# Altium footprint library All_Components.PcbLib: 55 footprints (part 3 of 4)
Each footprint in its own frame and in the unit in brackets; x right, y up, seen from the top. Pads: shape width x height; smd on the part's side, far side on the other; paste and mask are expansions set on the pad; w line width, h text height; cw(c..) or ccw(c..) is an arc to the next point about the centre after c.
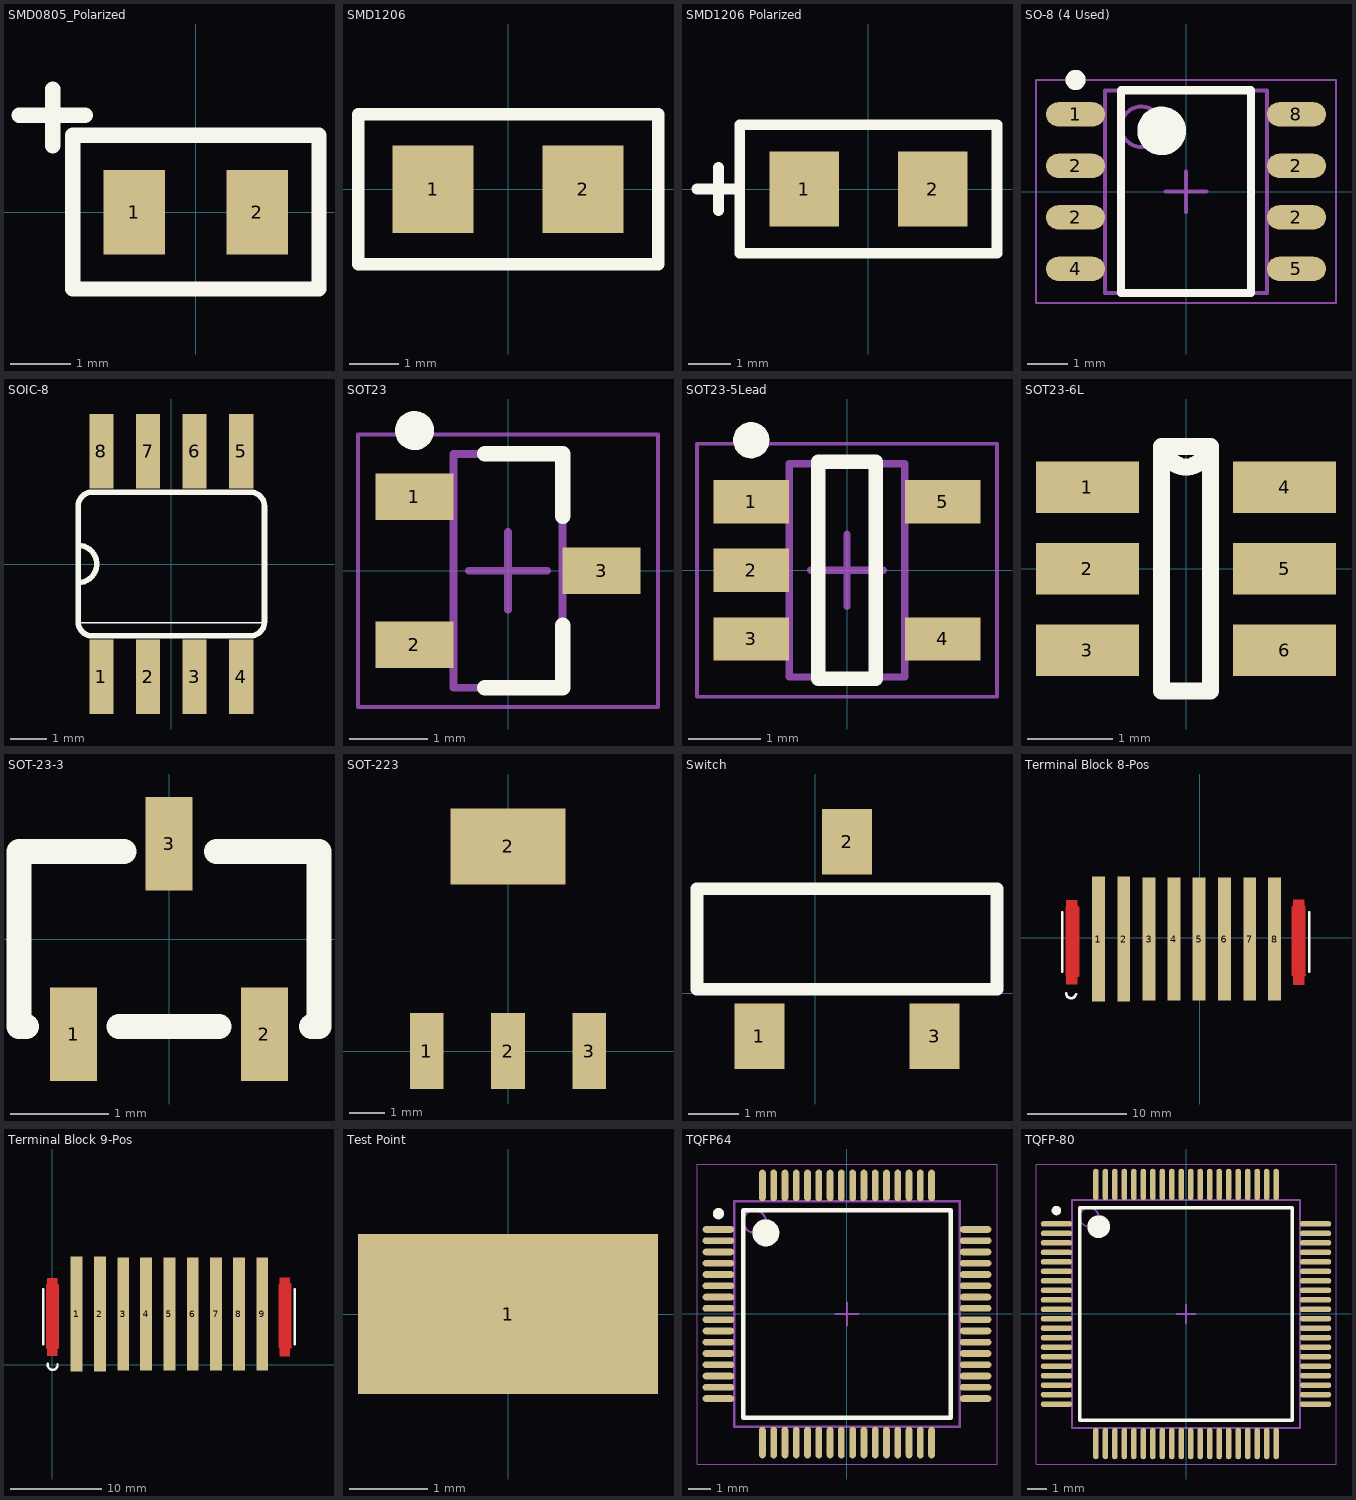
[diagram p2: the footprints below, top view; thin cyan lines are the x and y axes]

## SMD0805_Polarized [mil]
height 35.43
pads (2):
  rect 40x55 smd: 1(-40,0) 2(40,0)
Top Overlay:
  lines w10: -115,63 -72,63 ; -93,43 -93,80 ; -80,-50 80,-50 80,50 -80,50 -80,-7.5 -80,-50
3D body: height 19.68, standoff 0, extent -39.36,-24.8 39.38,24.42

## SMD1206 [mil]
pads (2):
  rect 65x70 smd: 1(-60,0) 2(60,0)
Top Overlay:
  lines w10: -120,-60 120,-60 120,60 -120,60 -120,-60
3D body: height 21.65, standoff 0, extent -61.02,-30.39 61.03,30.71

## SMD1206 Polarized [mil]
pads (2):
  rect 65x70 smd: 1(-60,0) 2(60,0)
Top Overlay:
  lines w10: -160,0 -120,0 ; -140,-20 -140,20 ; -120,-60 120,-60 120,60 -120,60 -120,-60
3D body: height 39.37, standoff 0, extent -65.49,-32.01 60.49,30.99

## SO-8 (4 Used) [mm] "SOIC, 8-Leads, Body 4.90x3.90mm, Pitch 1.27mm, IPC Medium Density"
height 1.75
pads (8):
  oval 1.45x0.6 smd: 1(-2.725,1.905) 2(-2.725,-0.635) 2(-2.725,0.635) 2(2.725,-0.635) 2(2.725,0.635) 4(-2.725,-1.905) 5(2.725,-1.905) 8(2.725,1.905)
Top Overlay:
  circle w0.6: c-0.6,1.5 r0.3
  circle w0.25: c-2.725,2.755 r0.125
  lines w0.2: -1.6,-2.5 1.6,-2.5 1.6,2.5 -1.6,2.5 -1.6,-2.5
Mechanical 13:
  circle w0.1: c-1.1,1.6 r0.5
  lines w0.1: -2,-2.5 2,-2.5 2,2.5 -2,2.5 -2,-2.5
Mechanical 15:
  lines w0.05: -3.7,-2.75 3.7,-2.75 3.7,2.75 -3.7,2.75 -3.7,-2.75
  lines w0.1: -0.5,0 0.5,0 ; 0,-0.5 0,0.5
3D body: height 1.75, standoff 0.1, extent -2,-2.5 2,2.5

## SOIC-8 [mil]
pads (8):
  rect 26x80 smd mask+3: 1(-75,-121) 2(-25,-121) 3(25,-121) 4(75,-121) 5(75,121) 6(25,121) 7(-25,121) 8(-75,121)
Top Overlay:
  lines w2: -100,-63 100,-63
  lines w6: -100,-20 ccw(c-100,0) -100,20 ; -100,-20 -100,20 ; -100,-20 -100,-62 ccw(c-85,-62) -85,-77 85,-77 ccw(c85,-62) 100,-62 100,62 ccw(c85,62) 85,77 -85,77 ccw(c-85,62) -100,62 -100,20
3D body: height 68, standoff 0, extent -103,-76 103,76

## SOT23 [mm] "SOT23, 3-Leads, Body 2.90x2.45mm, Pitch 0.95mm, IPC Medium Density"
height 1.1
pads (3):
  rect 1x0.6 smd: 1(-1.2,0.95) 2(-1.2,-0.95) 3(1.2,0)
Top Overlay:
  circle w0.25: c-1.2,1.8 r0.125
  lines w0.2: -0.3,-1.5 0.7,-1.5 0.7,-0.7 ; -0.3,1.5 0.7,1.5 0.7,0.7
Mechanical 13:
  lines w0.1: -0.7,-1.5 -0.7,1.5 0.7,1.5 0.7,-1.5 -0.7,-1.5
Mechanical 15:
  lines w0.05: -1.925,-1.75 -1.925,1.75 1.925,1.75 1.925,-1.75 -1.925,-1.75
  lines w0.1: -0.5,0 0.5,0 ; 0,-0.5 0,0.5
3D body: height 1, standoff 0, extent -1.257,-1.492 1.293,1.508

## SOT23-5Lead [mm] "SOT23, 5-Leads, Body 2.95x2.80mm, Pitch 0.95mm, IPC Medium Density"
height 1.45
pads (5):
  rect 1.05x0.6 smd: 1(-1.325,0.95) 2(-1.325,0) 3(-1.325,-0.95) 4(1.325,-0.95) 5(1.325,0.95)
Top Overlay:
  circle w0.25: c-1.325,1.8 r0.125
  lines w0.2: -0.4,-1.5 0.4,-1.5 0.4,1.5 -0.4,1.5 -0.4,-1.5
Mechanical 13:
  lines w0.1: -0.8,-1.475 -0.8,1.475 0.8,1.475 0.8,-1.475 -0.8,-1.475
Mechanical 15:
  lines w0.05: -2.075,-1.75 -2.075,1.75 2.075,1.75 2.075,-1.75 -2.075,-1.75
  lines w0.1: -0.5,0 0.5,0 ; 0,-0.5 0,0.5
3D body: height 0.92, standoff 0.01, extent -1.655,-1.501 1.549,1.499

## SOT23-6L [mm] "ESDA6V1BC6"
pads (6):
  rect 1.2x0.6 smd: 1(-1.15,0.95) 2(-1.15,0) 3(-1.15,-0.95) 4(1.15,0.95) 5(1.15,0) 6(1.15,-0.95)
Top Overlay:
  lines w0.2: -0.285,-1.425 0.285,-1.425 0.285,1.425 -0.238,1.425 ccw(c0,1.425) 0.238,1.425 -0.285,1.425 -0.285,-1.425
3D body: height 1.45, standoff 0.1, extent -0.875,-1.525 0.875,1.525

## SOT-23-3 [mm] "ESDCAN24-2BLY"
height 1.499
pads (3):
  rect 0.48x0.95 smd mask+0.076: 1(-0.97,-0.97) 2(0.97,-0.97) 3(0,0.97)
Top Overlay:
  lines w0.254: -1.448,-0.889 -1.524,-0.889 -1.524,0.889 -0.457,0.889 ; -0.508,-0.889 0.508,-0.889 ; 0.483,0.889 1.524,0.889 1.524,-0.889 1.448,-0.889
3D body: height 1.5, standoff 0.1, extent -1.52,-0.875 1.52,0.875

## SOT-223 [mm]
pads (4):
  rect 0.95x2.15 smd mask+0.076: 1(-2.3,0) 2(0,0) 3(2.3,0)
  rect 3.25x2.15 smd mask+0.076: 2(0,5.8)

## Switch [mm]
height 2.5
pads (3):
  rect 1x1.3 smd: 1(-1.118,-0.864) 2(0.635,3.023) 3(2.388,-0.864)
Top Overlay:
  lines w0.254: -2.362,0.076 -2.362,2.083 3.632,2.083 3.632,0.076 -2.362,0.076
3D body: height 2.48, standoff -0.04, extent -2.348,-1.089 3.652,3.111

## Terminal Block 8-Pos [mm]
height 11
pads (8):
  rect 1.3x12.6 smd: 1(-10.2,-0.122) 2(-7.65,-0.122)
  rect 1.3x12.4 smd: 3(-5.1,-0.122) 4(-2.6,-0.122) 5(-0.05,-0.122) 6(2.5,-0.122) 7(5.05,-0.122) 8(7.55,-0.122)
Top Layer:
  rectangle: 9.409,-4.772 10.559,3.878
  rectangle: -13.45,-4.722 -12.3,3.828
  lines w0.254: -13.4,-3.822 -13.4,3.078 -12.3,3.078 -12.25,3.028 -12.25,-3.822 -13.4,-3.822 ; 9.409,-3.722 9.459,-3.772 10.609,-3.772 10.559,-3.722 10.559,3.128 10.509,3.078 9.409,3.078 9.409,-3.722
Top Overlay:
  lines w0.254: -13.85,-3.422 -13.85,2.578 ; -13.454,-5.612 ccw(c-12.954,-5.588) -12.462,-5.683 ; 11.059,-3.422 11.059,2.578

## Terminal Block 9-Pos [mm]
height 11
pads (9):
  rect 1.3x12.6 smd: 1(2.652,5.568) 2(5.202,5.568)
  rect 1.3x12.4 smd: 3(7.752,5.568) 4(10.252,5.568) 5(12.802,5.568) 6(15.352,5.568) 7(17.902,5.568) 8(20.402,5.568) 9(22.952,5.568)
Top Layer:
  rectangle: -0.598,0.968 0.552,9.518
  rectangle: 24.852,0.918 26.002,9.568
  lines w0.254: -0.548,1.868 0.602,1.868 0.602,8.718 0.552,8.768 -0.548,8.768 -0.548,1.868 ; 24.852,1.968 24.852,8.768 25.952,8.768 26.002,8.818 26.002,1.968 26.052,1.918 24.902,1.918 24.852,1.968
Top Overlay:
  lines w0.254: -0.998,2.268 -0.998,8.268 ; -0.494,0.133 ccw(c0.025,0) 0.554,0.085 ; 26.502,2.268 26.502,8.268

## Test Point [mil]
pads (1):
  rect 150x80 smd: 1(0,0)
3D body: height 90, standoff 1, extent -75,-30 75,30

## TQFP64 [mm] "TSQFP, 64-Leads, Body 10.00x10.00mm, Pitch 0.50mm, IPC Medium Density"
height 1.6
pads (64):
  oval 1.4x0.3 smd: 1(-5.7,3.75) 2(-5.7,3.25) 3(-5.7,2.75) 4(-5.7,2.25) 5(-5.7,1.75) 6(-5.7,1.25) 7(-5.7,0.75) 8(-5.7,0.25) 9(-5.7,-0.25) 10(-5.7,-0.75) 11(-5.7,-1.25) 12(-5.7,-1.75) 13(-5.7,-2.25) 14(-5.7,-2.75) 15(-5.7,-3.25) 16(-5.7,-3.75) 33(5.7,-3.75) 34(5.7,-3.25) 35(5.7,-2.75) 36(5.7,-2.25) 37(5.7,-1.75) 38(5.7,-1.25) 39(5.7,-0.75) 40(5.7,-0.25) 41(5.7,0.25) 42(5.7,0.75) 43(5.7,1.25) 44(5.7,1.75) 45(5.7,2.25) 46(5.7,2.75) 47(5.7,3.25) 48(5.7,3.75)
  oval 0.3x1.4 smd: 17(-3.75,-5.7) 18(-3.25,-5.7) 19(-2.75,-5.7) 20(-2.25,-5.7) 21(-1.75,-5.7) 22(-1.25,-5.7) 23(-0.75,-5.7) 24(-0.25,-5.7) 25(0.25,-5.7) 26(0.75,-5.7) 27(1.25,-5.7) 28(1.75,-5.7) 29(2.25,-5.7) 30(2.75,-5.7) 31(3.25,-5.7) 32(3.75,-5.7) 49(3.75,5.7) 50(3.25,5.7) 51(2.75,5.7) 52(2.25,5.7) 53(1.75,5.7) 54(1.25,5.7) 55(0.75,5.7) 56(0.25,5.7) 57(-0.25,5.7) 58(-0.75,5.7) 59(-1.25,5.7) 60(-1.75,5.7) 61(-2.25,5.7) 62(-2.75,5.7) 63(-3.25,5.7) 64(-3.75,5.7)
Top Overlay:
  circle w0.25: c-5.7,4.45 r0.125
  circle w0.6: c-3.6,3.6 r0.3
  lines w0.2: -4.6,-4.6 -4.6,4.6 4.6,4.6 4.6,-4.6 -4.6,-4.6
Mechanical 13:
  circle w0.1: c-4.1,4.1 r0.5
  lines w0.1: -5,-5 -5,5 5,5 5,-5 -5,-5
Mechanical 15:
  lines w0.05: -6.65,-6.65 -6.65,6.65 6.65,6.65 6.65,-6.65 -6.65,-6.65
  lines w0.1: -0.5,0 0.5,0 ; 0,-0.5 0,0.5
3D body: height 1.6, standoff 0.05, extent -5,-5 5,5

## TQFP-80 [mm]
pads (80):
  oval 1.65x0.3 smd: 1(-6.841,4.74) 2(-6.841,4.24) 3(-6.841,3.74) 4(-6.841,3.24) 5(-6.841,2.74) 6(-6.841,2.24) 7(-6.841,1.74) 8(-6.841,1.24) 9(-6.841,0.74) 10(-6.841,0.24) 11(-6.841,-0.26) 12(-6.841,-0.76) 13(-6.841,-1.26) 14(-6.841,-1.76) 15(-6.841,-2.26) 16(-6.841,-2.76) 17(-6.841,-3.26) 18(-6.841,-3.76) 19(-6.841,-4.26) 20(-6.841,-4.76) 41(6.809,-4.76) 42(6.809,-4.26) 43(6.809,-3.76) 44(6.809,-3.26) 45(6.809,-2.76) 46(6.809,-2.26) 47(6.809,-1.76) 48(6.809,-1.26) 49(6.809,-0.76) 50(6.809,-0.26) 51(6.809,0.24) 52(6.809,0.74) 53(6.809,1.24) 54(6.809,1.74) 55(6.809,2.24) 56(6.809,2.74) 57(6.809,3.24) 58(6.809,3.74) 59(6.809,4.24) 60(6.809,4.74)
  oval 0.3x1.65 smd: 21(-4.766,-6.835) 22(-4.266,-6.835) 23(-3.766,-6.835) 24(-3.266,-6.835) 25(-2.766,-6.835) 26(-2.266,-6.835) 27(-1.766,-6.835) 28(-1.266,-6.835) 29(-0.766,-6.835) 30(-0.266,-6.835) 31(0.234,-6.835) 32(0.734,-6.835) 33(1.234,-6.835) 34(1.734,-6.835) 35(2.234,-6.835) 36(2.734,-6.835) 37(3.234,-6.835) 38(3.734,-6.835) 39(4.234,-6.835) 40(4.734,-6.835) 61(4.734,6.815) 62(4.234,6.815) 63(3.734,6.815) 64(3.234,6.815) 65(2.734,6.815) 66(2.234,6.815) 67(1.734,6.815) 68(1.234,6.815) 69(0.734,6.815) 70(0.234,6.815) 71(-0.266,6.815) 72(-0.766,6.815) 73(-1.266,6.815) 74(-1.766,6.815) 75(-2.266,6.815) 76(-2.766,6.815) 77(-3.266,6.815) 78(-3.766,6.815) 79(-4.266,6.815) 80(-4.766,6.815)
Top Overlay:
  circle w0.6: c-4.616,4.59 r0.3
  circle w0.25: c-6.841,5.44 r0.125
  lines w0.2: -5.616,-5.61 5.584,-5.61 5.584,5.59 -5.616,5.59 -5.616,-5.61
Mechanical 13:
  circle w0.1: c-5.116,5.09 r0.5
  lines w0.1: -6.016,-6.01 5.984,-6.01 5.984,5.99 -6.016,5.99 -6.016,-6.01
Mechanical 15:
  lines w0.05: -7.916,-7.91 7.884,-7.91 7.884,7.89 -7.916,7.89 -7.916,-7.91
  lines w0.1: -0.516,-0.01 0.484,-0.01 ; -0.016,-0.51 -0.016,0.49
3D body: height 2, standoff 0, extent -6.071,-6.02 6.172,6.071
3D body: height 1.4, standoff 0, extent -7.01,-7.015 6.99,6.985